# Altium schematic symbol library jlcpcb_2025_04_capacitors_extended_0201.schlib: 1175 symbols (part 6 of 7) (continued)
## LDK063ABJ105MP-F
designator C?  Capacitance: 1uF  (hidden comment: *)
Capacitor, Ceramic (MLCC), 1uF, ±20%, 10V, X5R, ±20%, SMD 0201; Manufacturer: Taiyo Yuden; Manufacturer Part Number: LDK063ABJ105MP-F; Package Size: 0201; JLCPCB Basic Part: No; JLCPCB Part Number: C319198; Supplier 1: LCSC; Category: Capacitors - MLCC; Supplier Part Number 1: C319198; Tolerance: ±20%; Voltage Rating: 10V; Temperature Coefficient: X5R; RoHS: Yes; ComponentLink1Description: Datasheet; ComponentLink1URL: https://wmsc.lcsc.com/wmsc/upload/file/pdf/v2/lcsc/1912111437_Taiyo-Yuden-LDK063ABJ105MP-F_C319198.pdf; ComponentLink2Description: JLCPCB Part URL; ComponentLink2URL: https://jlcpcb.com/partdetail/C319198; ComponentLink3Description: LCSC Part URL; ComponentLink3URL: https://lcsc.com/product-detail/Multilayer-Ceramic-Capacitors-MLCC---SMD-SMT_Taiyo-Yuden-Taiyo-Yuden-LDK063ABJ105MP-F_C319198.html
footprint CAP-0201 (0201 (0603M) Capacitor)
pins: 1, 2

## LDK063BBJ225MPLF
designator C?  Capacitance: 2.2uF  (hidden comment: *)
Capacitor, Ceramic (MLCC), 2.2uF, ±20%, 10V, X5R, ±20%, SMD 0201; Manufacturer: Taiyo Yuden; Manufacturer Part Number: LDK063BBJ225MPLF; Package Size: 0201; JLCPCB Basic Part: No; JLCPCB Part Number: C386031; Supplier 1: LCSC; Category: Capacitors - MLCC; Supplier Part Number 1: C386031; Tolerance: ±20%; Voltage Rating: 10V; Temperature Coefficient: X5R; RoHS: Yes; ComponentLink1Description: Datasheet; ComponentLink2Description: JLCPCB Part URL; ComponentLink2URL: https://jlcpcb.com/partdetail/C386031; ComponentLink3Description: LCSC Part URL; ComponentLink3URL: https://lcsc.com/product-detail/Multilayer-Ceramic-Capacitors-MLCC---SMD-SMT_Taiyo-Yuden-Taiyo-Yuden-LDK063BBJ225MPLF_C386031.html
footprint CAP-0201 (0201 (0603M) Capacitor)
pins: 1, 2

## LMK063BBJ105MPLF
designator C?  Capacitance: 1uF  (hidden comment: *)
Capacitor, Ceramic (MLCC), 1uF, ±20%, 10V, X5R, ±20%, SMD 0201; Manufacturer: Taiyo Yuden; Manufacturer Part Number: LMK063BBJ105MPLF; Package Size: 0201; JLCPCB Basic Part: No; JLCPCB Part Number: C386037; Supplier 1: LCSC; Category: Capacitors - MLCC; Supplier Part Number 1: C386037; Tolerance: ±20%; Voltage Rating: 10V; Temperature Coefficient: X5R; RoHS: Yes; ComponentLink1Description: Datasheet; ComponentLink1URL: https://wmsc.lcsc.com/wmsc/upload/file/pdf/v2/lcsc/1912111437_Taiyo-Yuden-LMK063BBJ105MPLF_C386037.pdf; ComponentLink2Description: JLCPCB Part URL; ComponentLink2URL: https://jlcpcb.com/partdetail/C386037; ComponentLink3Description: LCSC Part URL; ComponentLink3URL: https://lcsc.com/product-detail/Multilayer-Ceramic-Capacitors-MLCC---SMD-SMT_Taiyo-Yuden-Taiyo-Yuden-LMK063BBJ105MPLF_C386037.html
footprint CAP-0201 (0201 (0603M) Capacitor)
pins: 1, 2

## LMK063BJ224MP-F
designator C?  Capacitance: 220nF  (hidden comment: *)
Capacitor, Ceramic (MLCC), 220nF, ±20%, 10V, X5R, ±20%, SMD 0201; Manufacturer: Taiyo Yuden; Manufacturer Part Number: LMK063BJ224MP-F; Package Size: 0201; JLCPCB Basic Part: No; JLCPCB Part Number: C697608; Supplier 1: LCSC; Category: Capacitors - MLCC; Supplier Part Number 1: C697608; Tolerance: ±20%; Voltage Rating: 10V; Temperature Coefficient: X5R; RoHS: Yes; ComponentLink1Description: Datasheet; ComponentLink1URL: https://wmsc.lcsc.com/wmsc/upload/file/pdf/v2/lcsc/2007091536_Taiyo-Yuden-LMK063BJ224MP-F_C697608.pdf; ComponentLink2Description: JLCPCB Part URL; ComponentLink2URL: https://jlcpcb.com/partdetail/C697608; ComponentLink3Description: LCSC Part URL; ComponentLink3URL: https://lcsc.com/product-detail/Multilayer-Ceramic-Capacitors-MLCC---SMD-SMT_Taiyo-Yuden-Taiyo-Yuden-LMK063BJ224MP-F_C697608.html
footprint CAP-0201 (0201 (0603M) Capacitor)
pins: 1, 2

## LMK063C6224KP-F
designator C?  Capacitance: 220nF  (hidden comment: *)
Capacitor, Ceramic (MLCC), 220nF, ±10%, 10V, X6S, ±10%, SMD 0201; Manufacturer: Taiyo Yuden; Manufacturer Part Number: LMK063C6224KP-F; Package Size: 0201; JLCPCB Basic Part: No; JLCPCB Part Number: C386039; Supplier 1: LCSC; Category: Capacitors - MLCC; Supplier Part Number 1: C386039; Tolerance: ±10%; Voltage Rating: 10V; Temperature Coefficient: X6S; RoHS: Yes; ComponentLink1Description: Datasheet; ComponentLink1URL: https://wmsc.lcsc.com/wmsc/upload/file/pdf/v2/lcsc/2108160930_Taiyo-Yuden-LMK063C6224KP-F_C386039.pdf; ComponentLink2Description: JLCPCB Part URL; ComponentLink2URL: https://jlcpcb.com/partdetail/C386039; ComponentLink3Description: LCSC Part URL; ComponentLink3URL: https://lcsc.com/product-detail/Multilayer-Ceramic-Capacitors-MLCC---SMD-SMT_Taiyo-Yuden-Taiyo-Yuden-LMK063C6224KP-F_C386039.html
footprint CAP-0201 (0201 (0603M) Capacitor)
pins: 1, 2

## MSASL063BC6474KFNB33
designator C?  Capacitance: 0.47uF  (hidden comment: *)
Capacitor, Ceramic (MLCC), 0.47uF, ±10%, 10V, X6S, ±10%, SMD 0201; Manufacturer: Taiyo Yuden; Manufacturer Part Number: MSASL063BC6474KFNB33; Package Size: 0201; JLCPCB Basic Part: No; JLCPCB Part Number: C2169138; Supplier 1: LCSC; Category: Capacitors - MLCC; Supplier Part Number 1: C2169138; Tolerance: ±10%; Voltage Rating: 10V; Temperature Coefficient: X6S; RoHS: Yes; ComponentLink1Description: Datasheet; ComponentLink1URL: https://wmsc.lcsc.com/wmsc/upload/file/pdf/v2/lcsc/2307211405_Taiyo-Yuden-MSASL063BC6474KFNB33_C2169138.pdf; ComponentLink2Description: JLCPCB Part URL; ComponentLink2URL: https://jlcpcb.com/partdetail/C2169138; ComponentLink3Description: LCSC Part URL; ComponentLink3URL: https://lcsc.com/product-detail/Multilayer-Ceramic-Capacitors-MLCC---SMD-SMT_Taiyo-Yuden-Taiyo-Yuden-LMK063BC6474KPLF_C2169138.html
footprint CAP-0201 (0201 (0603M) Capacitor)
pins: 1, 2

## MSASU063SCG201JFNA01
designator C?  Capacitance: 200pF  (hidden comment: *)
Capacitor, Ceramic (MLCC), 200pF, ±5%, 50V, C0G, ±5%, SMD 0201; Manufacturer: Taiyo Yuden; Manufacturer Part Number: MSASU063SCG201JFNA01; Package Size: 0201; JLCPCB Basic Part: No; JLCPCB Part Number: C5383036; Supplier 1: LCSC; Category: Capacitors - MLCC; Supplier Part Number 1: C5383036; Tolerance: ±5%; Voltage Rating: 50V; Temperature Coefficient: C0G; RoHS: Yes; ComponentLink1Description: Datasheet; ComponentLink1URL: https://wmsc.lcsc.com/wmsc/upload/file/pdf/v2/lcsc/2303301000_Taiyo-Yuden-MSASU063SCG201JFNA01_C5383036.pdf; ComponentLink2Description: JLCPCB Part URL; ComponentLink2URL: https://jlcpcb.com/partdetail/C5383036; ComponentLink3Description: LCSC Part URL; ComponentLink3URL: https://lcsc.com/product-detail/Multilayer-Ceramic-Capacitors-MLCC---SMD-SMT_Taiyo-Yuden-Taiyo-Yuden-MSASU063SCG201JFNA01_C5383036.html
footprint CAP-0201 (0201 (0603M) Capacitor)
pins: 1, 2

## RF03N0R3B500CT
designator C?  Capacitance: 0.3pF  (hidden comment: *)
Capacitor, Ceramic (MLCC), 0.3pF, 50V, NP0, SMD 0201; Manufacturer: Walsin Tech Corp; Manufacturer Part Number: RF03N0R3B500CT; Package Size: 0201; JLCPCB Basic Part: No; JLCPCB Part Number: C172865; Supplier 1: LCSC; Category: Capacitors - MLCC; Supplier Part Number 1: C172865; Voltage Rating: 50V; Temperature Coefficient: NP0; RoHS: Yes; ComponentLink1Description: Datasheet; ComponentLink1URL: https://wmsc.lcsc.com/wmsc/upload/file/pdf/v2/lcsc/2110281730_Walsin-Tech-Corp-RF03N0R3B500CT_C172865.pdf; ComponentLink2Description: JLCPCB Part URL; ComponentLink2URL: https://jlcpcb.com/partdetail/C172865; ComponentLink3Description: LCSC Part URL; ComponentLink3URL: https://lcsc.com/product-detail/Multilayer-Ceramic-Capacitors-MLCC---SMD-SMT_Walsin-Tech-Corp-Walsin-Tech-Corp-RF03N0R3B500CT_C172865.html
footprint CAP-0201 (0201 (0603M) Capacitor)
pins: 1, 2

## RF03N0R4B500CT
designator C?  Capacitance: 0.4pF  (hidden comment: *)
Capacitor, Ceramic (MLCC), 0.4pF, 50V, NP0, SMD 0201; Manufacturer: Walsin Tech Corp; Manufacturer Part Number: RF03N0R4B500CT; Package Size: 0201; JLCPCB Basic Part: No; JLCPCB Part Number: C384705; Supplier 1: LCSC; Category: Capacitors - MLCC; Supplier Part Number 1: C384705; Voltage Rating: 50V; Temperature Coefficient: NP0; RoHS: Yes; ComponentLink1Description: Datasheet; ComponentLink1URL: https://wmsc.lcsc.com/wmsc/upload/file/pdf/v2/lcsc/1912111437_Walsin-Tech-Corp-RF03N0R4B500CT_C384705.pdf; ComponentLink2Description: JLCPCB Part URL; ComponentLink2URL: https://jlcpcb.com/partdetail/C384705; ComponentLink3Description: LCSC Part URL; ComponentLink3URL: https://lcsc.com/product-detail/Multilayer-Ceramic-Capacitors-MLCC---SMD-SMT_Walsin-Tech-Corp-Walsin-Tech-Corp-RF03N0R4B500CT_C384705.html
footprint CAP-0201 (0201 (0603M) Capacitor)
pins: 1, 2

## RF03N0R5A250CT
designator C?  Capacitance: 0.5pF  (hidden comment: *)
Capacitor, Ceramic (MLCC), 0.5pF, 25V, NP0, SMD 0201; Manufacturer: Walsin Tech Corp; Manufacturer Part Number: RF03N0R5A250CT; Package Size: 0201; JLCPCB Basic Part: No; JLCPCB Part Number: C384704; Supplier 1: LCSC; Category: Capacitors - MLCC; Supplier Part Number 1: C384704; Voltage Rating: 25V; Temperature Coefficient: NP0; RoHS: Yes; ComponentLink1Description: Datasheet; ComponentLink1URL: https://wmsc.lcsc.com/wmsc/upload/file/pdf/v2/lcsc/2401181555_Walsin-Tech-Corp-RF03N0R5A250CT_C384704.pdf; ComponentLink2Description: JLCPCB Part URL; ComponentLink2URL: https://jlcpcb.com/partdetail/C384704; ComponentLink3Description: LCSC Part URL; ComponentLink3URL: https://lcsc.com/product-detail/Multilayer-Ceramic-Capacitors-MLCC---SMD-SMT_Walsin-Tech-Corp-Walsin-Tech-Corp-RF03N0R5A250CT_C384704.html
footprint CAP-0201 (0201 (0603M) Capacitor)
pins: 1, 2

## RF03N0R5B250CT
designator C?  Capacitance: 0.5pF  (hidden comment: *)
Capacitor, Ceramic (MLCC), 0.5pF, 25V, NP0, SMD 0201; Manufacturer: Walsin Tech Corp; Manufacturer Part Number: RF03N0R5B250CT; Package Size: 0201; JLCPCB Basic Part: No; JLCPCB Part Number: C172836; Supplier 1: LCSC; Category: Capacitors - MLCC; Supplier Part Number 1: C172836; Voltage Rating: 25V; Temperature Coefficient: NP0; RoHS: Yes; ComponentLink1Description: Datasheet; ComponentLink1URL: https://wmsc.lcsc.com/wmsc/upload/file/pdf/v2/lcsc/2110281730_Walsin-Tech-Corp-RF03N0R5B250CT_C172836.pdf; ComponentLink2Description: JLCPCB Part URL; ComponentLink2URL: https://jlcpcb.com/partdetail/C172836; ComponentLink3Description: LCSC Part URL; ComponentLink3URL: https://lcsc.com/product-detail/Multilayer-Ceramic-Capacitors-MLCC---SMD-SMT_Walsin-Tech-Corp-Walsin-Tech-Corp-RF03N0R5B250CT_C172836.html
footprint CAP-0201 (0201 (0603M) Capacitor)
pins: 1, 2

## RF03N0R6B500CT
designator C?  Capacitance: 0.6pF  (hidden comment: *)
Capacitor, Ceramic (MLCC), 0.6pF, 50V, NP0, SMD 0201; Manufacturer: Walsin Tech Corp; Manufacturer Part Number: RF03N0R6B500CT; Package Size: 0201; JLCPCB Basic Part: No; JLCPCB Part Number: C384703; Supplier 1: LCSC; Category: Capacitors - MLCC; Supplier Part Number 1: C384703; Voltage Rating: 50V; Temperature Coefficient: NP0; RoHS: Yes; ComponentLink1Description: Datasheet; ComponentLink1URL: https://wmsc.lcsc.com/wmsc/upload/file/pdf/v2/lcsc/2401181555_Walsin-Tech-Corp-RF03N0R6B500CT_C384703.pdf; ComponentLink2Description: JLCPCB Part URL; ComponentLink2URL: https://jlcpcb.com/partdetail/C384703; ComponentLink3Description: LCSC Part URL; ComponentLink3URL: https://lcsc.com/product-detail/Multilayer-Ceramic-Capacitors-MLCC---SMD-SMT_Walsin-Tech-Corp-Walsin-Tech-Corp-RF03N0R6B500CT_C384703.html
footprint CAP-0201 (0201 (0603M) Capacitor)
pins: 1, 2

## RF03N0R7A500CT
designator C?  Capacitance: 0.7pF  (hidden comment: *)
Capacitor, Ceramic (MLCC), 0.7pF, 50V, NP0, SMD 0201; Manufacturer: Walsin Tech Corp; Manufacturer Part Number: RF03N0R7A500CT; Package Size: 0201; JLCPCB Basic Part: No; JLCPCB Part Number: C384702; Supplier 1: LCSC; Category: Capacitors - MLCC; Supplier Part Number 1: C384702; Voltage Rating: 50V; Temperature Coefficient: NP0; RoHS: Yes; ComponentLink1Description: Datasheet; ComponentLink2Description: JLCPCB Part URL; ComponentLink2URL: https://jlcpcb.com/partdetail/C384702; ComponentLink3Description: LCSC Part URL; ComponentLink3URL: https://lcsc.com/product-detail/Multilayer-Ceramic-Capacitors-MLCC---SMD-SMT_Walsin-Tech-Corp-Walsin-Tech-Corp-RF03N0R7A500CT_C384702.html
footprint CAP-0201 (0201 (0603M) Capacitor)
pins: 1, 2

## RF03N0R7B250CT
designator C?  Capacitance: 0.7pF  (hidden comment: *)
Capacitor, Ceramic (MLCC), 0.7pF, 25V, NP0, SMD 0201; Manufacturer: Walsin Tech Corp; Manufacturer Part Number: RF03N0R7B250CT; Package Size: 0201; JLCPCB Basic Part: No; JLCPCB Part Number: C384701; Supplier 1: LCSC; Category: Capacitors - MLCC; Supplier Part Number 1: C384701; Voltage Rating: 25V; Temperature Coefficient: NP0; RoHS: Yes; ComponentLink1Description: Datasheet; ComponentLink1URL: https://wmsc.lcsc.com/wmsc/upload/file/pdf/v2/lcsc/2401181554_Walsin-Tech-Corp-RF03N0R7B250CT_C384701.pdf; ComponentLink2Description: JLCPCB Part URL; ComponentLink2URL: https://jlcpcb.com/partdetail/C384701; ComponentLink3Description: LCSC Part URL; ComponentLink3URL: https://lcsc.com/product-detail/Multilayer-Ceramic-Capacitors-MLCC---SMD-SMT_Walsin-Tech-Corp-Walsin-Tech-Corp-RF03N0R7B250CT_C384701.html
footprint CAP-0201 (0201 (0603M) Capacitor)
pins: 1, 2

## RF03N0R7B500CT
designator C?  Capacitance: 0.7pF  (hidden comment: *)
Capacitor, Ceramic (MLCC), 0.7pF, 50V, NP0, SMD 0201; Manufacturer: Walsin Tech Corp; Manufacturer Part Number: RF03N0R7B500CT; Package Size: 0201; JLCPCB Basic Part: No; JLCPCB Part Number: C384700; Supplier 1: LCSC; Category: Capacitors - MLCC; Supplier Part Number 1: C384700; Voltage Rating: 50V; Temperature Coefficient: NP0; RoHS: Yes; ComponentLink1Description: Datasheet; ComponentLink1URL: https://wmsc.lcsc.com/wmsc/upload/file/pdf/v2/lcsc/2401181554_Walsin-Tech-Corp-RF03N0R7B500CT_C384700.pdf; ComponentLink2Description: JLCPCB Part URL; ComponentLink2URL: https://jlcpcb.com/partdetail/C384700; ComponentLink3Description: LCSC Part URL; ComponentLink3URL: https://lcsc.com/product-detail/Multilayer-Ceramic-Capacitors-MLCC---SMD-SMT_Walsin-Tech-Corp-Walsin-Tech-Corp-RF03N0R7B500CT_C384700.html
footprint CAP-0201 (0201 (0603M) Capacitor)
pins: 1, 2

## RF03N0R8B500CT
designator C?  Capacitance: 0.8pF  (hidden comment: *)
Capacitor, Ceramic (MLCC), 0.8pF, 50V, NP0, SMD 0201; Manufacturer: Walsin Tech Corp; Manufacturer Part Number: RF03N0R8B500CT; Package Size: 0201; JLCPCB Basic Part: No; JLCPCB Part Number: C384699; Supplier 1: LCSC; Category: Capacitors - MLCC; Supplier Part Number 1: C384699; Voltage Rating: 50V; Temperature Coefficient: NP0; RoHS: Yes; ComponentLink1Description: Datasheet; ComponentLink1URL: https://wmsc.lcsc.com/wmsc/upload/file/pdf/v2/lcsc/2401181554_Walsin-Tech-Corp-RF03N0R8B500CT_C384699.pdf; ComponentLink2Description: JLCPCB Part URL; ComponentLink2URL: https://jlcpcb.com/partdetail/C384699; ComponentLink3Description: LCSC Part URL; ComponentLink3URL: https://lcsc.com/product-detail/Multilayer-Ceramic-Capacitors-MLCC---SMD-SMT_Walsin-Tech-Corp-Walsin-Tech-Corp-RF03N0R8B500CT_C384699.html
footprint CAP-0201 (0201 (0603M) Capacitor)
pins: 1, 2

## RF03N0R9B500CT
designator C?  Capacitance: 0.9pF  (hidden comment: *)
Capacitor, Ceramic (MLCC), 0.9pF, 50V, NP0, SMD 0201; Manufacturer: Walsin Tech Corp; Manufacturer Part Number: RF03N0R9B500CT; Package Size: 0201; JLCPCB Basic Part: No; JLCPCB Part Number: C384698; Supplier 1: LCSC; Category: Capacitors - MLCC; Supplier Part Number 1: C384698; Voltage Rating: 50V; Temperature Coefficient: NP0; RoHS: Yes; ComponentLink1Description: Datasheet; ComponentLink2Description: JLCPCB Part URL; ComponentLink2URL: https://jlcpcb.com/partdetail/C384698; ComponentLink3Description: LCSC Part URL; ComponentLink3URL: https://lcsc.com/product-detail/Multilayer-Ceramic-Capacitors-MLCC---SMD-SMT_Walsin-Tech-Corp-Walsin-Tech-Corp-RF03N0R9B500CT_C384698.html
footprint CAP-0201 (0201 (0603M) Capacitor)
pins: 1, 2

## RF03N1R0A500CT
designator C?  Capacitance: 1pF  (hidden comment: *)
Capacitor, Ceramic (MLCC), 1pF, 50V, NP0, SMD 0201; Manufacturer: Walsin Tech Corp; Manufacturer Part Number: RF03N1R0A500CT; Package Size: 0201; JLCPCB Basic Part: No; JLCPCB Part Number: C384697; Supplier 1: LCSC; Category: Capacitors - MLCC; Supplier Part Number 1: C384697; Voltage Rating: 50V; Temperature Coefficient: NP0; RoHS: Yes; ComponentLink1Description: Datasheet; ComponentLink2Description: JLCPCB Part URL; ComponentLink2URL: https://jlcpcb.com/partdetail/C384697; ComponentLink3Description: LCSC Part URL; ComponentLink3URL: https://lcsc.com/product-detail/Multilayer-Ceramic-Capacitors-MLCC---SMD-SMT_Walsin-Tech-Corp-Walsin-Tech-Corp-RF03N1R0A500CT_C384697.html
footprint CAP-0201 (0201 (0603M) Capacitor)
pins: 1, 2

## RF03N1R0B250CT
designator C?  Capacitance: 1pF  (hidden comment: *)
Capacitor, Ceramic (MLCC), 1pF, 25V, NP0, SMD 0201; Manufacturer: Walsin Tech Corp; Manufacturer Part Number: RF03N1R0B250CT; Package Size: 0201; JLCPCB Basic Part: No; JLCPCB Part Number: C2894171; Supplier 1: LCSC; Category: Capacitors - MLCC; Supplier Part Number 1: C2894171; Voltage Rating: 25V; Temperature Coefficient: NP0; RoHS: Yes; ComponentLink1Description: Datasheet; ComponentLink1URL: https://wmsc.lcsc.com/wmsc/upload/file/pdf/v2/lcsc/2109081830_Walsin-Tech-Corp-RF03N1R0B250CT_C2894171.pdf; ComponentLink2Description: JLCPCB Part URL; ComponentLink2URL: https://jlcpcb.com/partdetail/C2894171; ComponentLink3Description: LCSC Part URL; ComponentLink3URL: https://lcsc.com/product-detail/Multilayer-Ceramic-Capacitors-MLCC---SMD-SMT_Walsin-Tech-Corp-Walsin-Tech-Corp-RF03N1R0B250CT_C2894171.html
footprint CAP-0201 (0201 (0603M) Capacitor)
pins: 1, 2

## RF03N1R3B250CT
designator C?  Capacitance: 1.3pF  (hidden comment: *)
Capacitor, Ceramic (MLCC), 1.3pF, 25V, NP0, SMD 0201; Manufacturer: Walsin Tech Corp; Manufacturer Part Number: RF03N1R3B250CT; Package Size: 0201; JLCPCB Basic Part: No; JLCPCB Part Number: C2894182; Supplier 1: LCSC; Category: Capacitors - MLCC; Supplier Part Number 1: C2894182; Voltage Rating: 25V; Temperature Coefficient: NP0; RoHS: Yes; ComponentLink1Description: Datasheet; ComponentLink1URL: https://wmsc.lcsc.com/wmsc/upload/file/pdf/v2/lcsc/2109081830_Walsin-Tech-Corp-RF03N1R3B250CT_C2894182.pdf; ComponentLink2Description: JLCPCB Part URL; ComponentLink2URL: https://jlcpcb.com/partdetail/C2894182; ComponentLink3Description: LCSC Part URL; ComponentLink3URL: https://lcsc.com/product-detail/Multilayer-Ceramic-Capacitors-MLCC---SMD-SMT_Walsin-Tech-Corp-Walsin-Tech-Corp-RF03N1R3B250CT_C2894182.html
footprint CAP-0201 (0201 (0603M) Capacitor)
pins: 1, 2

## RF03N1R3B500CT
designator C?  Capacitance: 1.3pF  (hidden comment: *)
Capacitor, Ceramic (MLCC), 1.3pF, 50V, NP0, SMD 0201; Manufacturer: Walsin Tech Corp; Manufacturer Part Number: RF03N1R3B500CT; Package Size: 0201; JLCPCB Basic Part: No; JLCPCB Part Number: C384696; Supplier 1: LCSC; Category: Capacitors - MLCC; Supplier Part Number 1: C384696; Voltage Rating: 50V; Temperature Coefficient: NP0; RoHS: Yes; ComponentLink1Description: Datasheet; ComponentLink2Description: JLCPCB Part URL; ComponentLink2URL: https://jlcpcb.com/partdetail/C384696; ComponentLink3Description: LCSC Part URL; ComponentLink3URL: https://lcsc.com/product-detail/Multilayer-Ceramic-Capacitors-MLCC---SMD-SMT_Walsin-Tech-Corp-Walsin-Tech-Corp-RF03N1R3B500CT_C384696.html
footprint CAP-0201 (0201 (0603M) Capacitor)
pins: 1, 2

## RF03N1R4B250CT
designator C?  Capacitance: 1.4pF  (hidden comment: *)
Capacitor, Ceramic (MLCC), 1.4pF, 25V, NP0, SMD 0201; Manufacturer: Walsin Tech Corp; Manufacturer Part Number: RF03N1R4B250CT; Package Size: 0201; JLCPCB Basic Part: No; JLCPCB Part Number: C396862; Supplier 1: LCSC; Category: Capacitors - MLCC; Supplier Part Number 1: C396862; Voltage Rating: 25V; Temperature Coefficient: NP0; RoHS: Yes; ComponentLink1Description: Datasheet; ComponentLink1URL: https://wmsc.lcsc.com/wmsc/upload/file/pdf/v2/lcsc/2304140030_Walsin-Tech-Corp-RF03N1R4B250CT_C396862.pdf; ComponentLink2Description: JLCPCB Part URL; ComponentLink2URL: https://jlcpcb.com/partdetail/C396862; ComponentLink3Description: LCSC Part URL; ComponentLink3URL: https://lcsc.com/product-detail/Multilayer-Ceramic-Capacitors-MLCC---SMD-SMT_Walsin-Tech-Corp-Walsin-Tech-Corp-RF03N1R4B250CT_C396862.html
footprint CAP-0201 (0201 (0603M) Capacitor)
pins: 1, 2

## RF03N1R6B250CT
designator C?  Capacitance: 1.6pF  (hidden comment: *)
Capacitor, Ceramic (MLCC), 1.6pF, 25V, NP0, SMD 0201; Manufacturer: Walsin Tech Corp; Manufacturer Part Number: RF03N1R6B250CT; Package Size: 0201; JLCPCB Basic Part: No; JLCPCB Part Number: C384695; Supplier 1: LCSC; Category: Capacitors - MLCC; Supplier Part Number 1: C384695; Voltage Rating: 25V; Temperature Coefficient: NP0; RoHS: Yes; ComponentLink1Description: Datasheet; ComponentLink1URL: https://wmsc.lcsc.com/wmsc/upload/file/pdf/v2/lcsc/2401181554_Walsin-Tech-Corp-RF03N1R6B250CT_C384695.pdf; ComponentLink2Description: JLCPCB Part URL; ComponentLink2URL: https://jlcpcb.com/partdetail/C384695; ComponentLink3Description: LCSC Part URL; ComponentLink3URL: https://lcsc.com/product-detail/Multilayer-Ceramic-Capacitors-MLCC---SMD-SMT_Walsin-Tech-Corp-Walsin-Tech-Corp-RF03N1R6B250CT_C384695.html
footprint CAP-0201 (0201 (0603M) Capacitor)
pins: 1, 2

## RF03N1R8A500CT
designator C?  Capacitance: 1.8pF  (hidden comment: *)
Capacitor, Ceramic (MLCC), 1.8pF, 50V, NP0, SMD 0201; Manufacturer: Walsin Tech Corp; Manufacturer Part Number: RF03N1R8A500CT; Package Size: 0201; JLCPCB Basic Part: No; JLCPCB Part Number: C384694; Supplier 1: LCSC; Category: Capacitors - MLCC; Supplier Part Number 1: C384694; Voltage Rating: 50V; Temperature Coefficient: NP0; RoHS: Yes; ComponentLink1Description: Datasheet; ComponentLink2Description: JLCPCB Part URL; ComponentLink2URL: https://jlcpcb.com/partdetail/C384694; ComponentLink3Description: LCSC Part URL; ComponentLink3URL: https://lcsc.com/product-detail/Multilayer-Ceramic-Capacitors-MLCC---SMD-SMT_Walsin-Tech-Corp-Walsin-Tech-Corp-RF03N1R8A500CT_C384694.html
footprint CAP-0201 (0201 (0603M) Capacitor)
pins: 1, 2

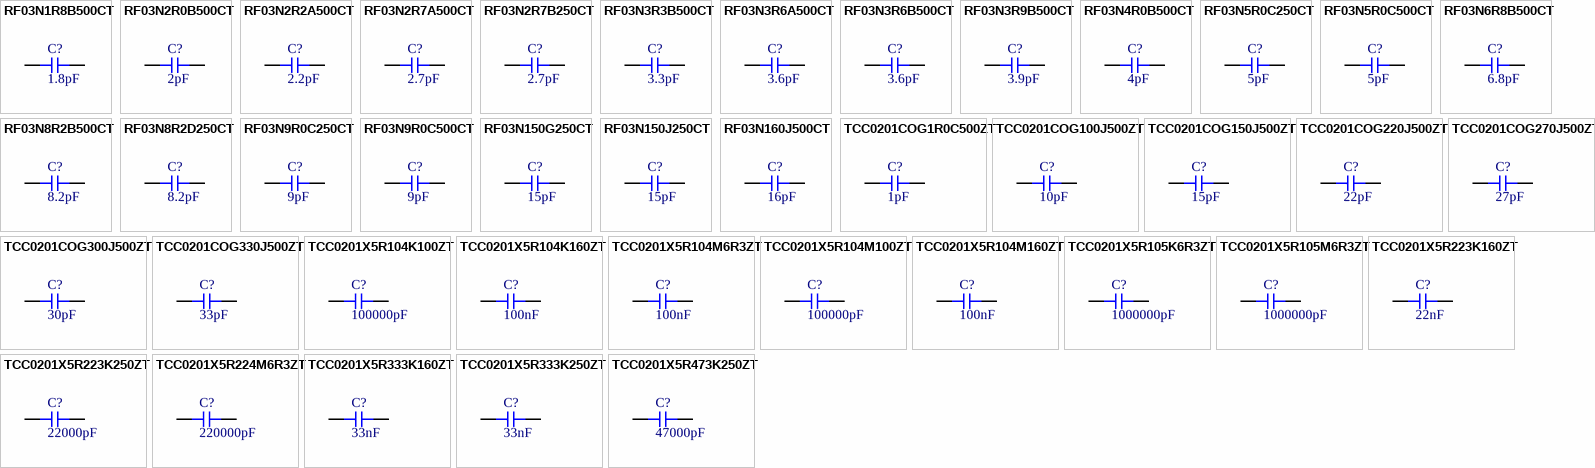
[diagram p27: symbols RF03N1R8B500CT to TCC0201X5R473K250ZT]

## RF03N1R8B500CT
designator C?  Capacitance: 1.8pF  (hidden comment: *)
Capacitor, Ceramic (MLCC), 1.8pF, 50V, NP0, SMD 0201; Manufacturer: Walsin Tech Corp; Manufacturer Part Number: RF03N1R8B500CT; Package Size: 0201; JLCPCB Basic Part: No; JLCPCB Part Number: C2875466; Supplier 1: LCSC; Category: Capacitors - MLCC; Supplier Part Number 1: C2875466; Voltage Rating: 50V; Temperature Coefficient: NP0; RoHS: Yes; ComponentLink1Description: Datasheet; ComponentLink1URL: https://wmsc.lcsc.com/wmsc/upload/file/pdf/v2/lcsc/2108241230_Walsin-Tech-Corp-RF03N1R8B500CT_C2875466.pdf; ComponentLink2Description: JLCPCB Part URL; ComponentLink2URL: https://jlcpcb.com/partdetail/C2875466; ComponentLink3Description: LCSC Part URL; ComponentLink3URL: https://lcsc.com/product-detail/Multilayer-Ceramic-Capacitors-MLCC---SMD-SMT_Walsin-Tech-Corp-Walsin-Tech-Corp-RF03N1R8B500CT_C2875466.html
footprint CAP-0201 (0201 (0603M) Capacitor)
pins: 1, 2

## RF03N2R0B500CT
designator C?  Capacitance: 2pF  (hidden comment: *)
Capacitor, Ceramic (MLCC), 2pF, 50V, NP0, SMD 0201; Manufacturer: Walsin Tech Corp; Manufacturer Part Number: RF03N2R0B500CT; Package Size: 0201; JLCPCB Basic Part: No; JLCPCB Part Number: C880868; Supplier 1: LCSC; Category: Capacitors - MLCC; Supplier Part Number 1: C880868; Voltage Rating: 50V; Temperature Coefficient: NP0; RoHS: Yes; ComponentLink1Description: Datasheet; ComponentLink1URL: https://wmsc.lcsc.com/wmsc/upload/file/pdf/v2/lcsc/2010162041_Walsin-Tech-Corp-RF03N2R0B500CT_C880868.pdf; ComponentLink2Description: JLCPCB Part URL; ComponentLink2URL: https://jlcpcb.com/partdetail/C880868; ComponentLink3Description: LCSC Part URL; ComponentLink3URL: https://lcsc.com/product-detail/Multilayer-Ceramic-Capacitors-MLCC---SMD-SMT_Walsin-Tech-Corp-Walsin-Tech-Corp-RF03N2R0B500CT_C880868.html
footprint CAP-0201 (0201 (0603M) Capacitor)
pins: 1, 2

## RF03N2R2A500CT
designator C?  Capacitance: 2.2pF  (hidden comment: *)
Capacitor, Ceramic (MLCC), 2.2pF, 50V, NP0, SMD 0201; Manufacturer: Walsin Tech Corp; Manufacturer Part Number: RF03N2R2A500CT; Package Size: 0201; JLCPCB Basic Part: No; JLCPCB Part Number: C384693; Supplier 1: LCSC; Category: Capacitors - MLCC; Supplier Part Number 1: C384693; Voltage Rating: 50V; Temperature Coefficient: NP0; RoHS: Yes; ComponentLink1Description: Datasheet; ComponentLink2Description: JLCPCB Part URL; ComponentLink2URL: https://jlcpcb.com/partdetail/C384693; ComponentLink3Description: LCSC Part URL; ComponentLink3URL: https://lcsc.com/product-detail/Multilayer-Ceramic-Capacitors-MLCC---SMD-SMT_Walsin-Tech-Corp-Walsin-Tech-Corp-RF03N2R2A500CT_C384693.html
footprint CAP-0201 (0201 (0603M) Capacitor)
pins: 1, 2

## RF03N2R7A500CT
designator C?  Capacitance: 2.7pF  (hidden comment: *)
Capacitor, Ceramic (MLCC), 2.7pF, 50V, NP0, SMD 0201; Manufacturer: Walsin Tech Corp; Manufacturer Part Number: RF03N2R7A500CT; Package Size: 0201; JLCPCB Basic Part: No; JLCPCB Part Number: C384692; Supplier 1: LCSC; Category: Capacitors - MLCC; Supplier Part Number 1: C384692; Voltage Rating: 50V; Temperature Coefficient: NP0; RoHS: Yes; ComponentLink1Description: Datasheet; ComponentLink2Description: JLCPCB Part URL; ComponentLink2URL: https://jlcpcb.com/partdetail/C384692; ComponentLink3Description: LCSC Part URL; ComponentLink3URL: https://lcsc.com/product-detail/Multilayer-Ceramic-Capacitors-MLCC---SMD-SMT_Walsin-Tech-Corp-Walsin-Tech-Corp-RF03N2R7A500CT_C384692.html
footprint CAP-0201 (0201 (0603M) Capacitor)
pins: 1, 2

## RF03N2R7B250CT
designator C?  Capacitance: 2.7pF  (hidden comment: *)
Capacitor, Ceramic (MLCC), 2.7pF, 25V, NP0, SMD 0201; Manufacturer: Walsin Tech Corp; Manufacturer Part Number: RF03N2R7B250CT; Package Size: 0201; JLCPCB Basic Part: No; JLCPCB Part Number: C396863; Supplier 1: LCSC; Category: Capacitors - MLCC; Supplier Part Number 1: C396863; Voltage Rating: 25V; Temperature Coefficient: NP0; RoHS: Yes; ComponentLink1Description: Datasheet; ComponentLink1URL: https://wmsc.lcsc.com/wmsc/upload/file/pdf/v2/lcsc/2304140030_Walsin-Tech-Corp-RF03N2R7B250CT_C396863.pdf; ComponentLink2Description: JLCPCB Part URL; ComponentLink2URL: https://jlcpcb.com/partdetail/C396863; ComponentLink3Description: LCSC Part URL; ComponentLink3URL: https://lcsc.com/product-detail/Multilayer-Ceramic-Capacitors-MLCC---SMD-SMT_Walsin-Tech-Corp-Walsin-Tech-Corp-RF03N2R7B250CT_C396863.html
footprint CAP-0201 (0201 (0603M) Capacitor)
pins: 1, 2

## RF03N3R3B500CT
designator C?  Capacitance: 3.3pF  (hidden comment: *)
Capacitor, Ceramic (MLCC), 3.3pF, 50V, NP0, SMD 0201; Manufacturer: Walsin Tech Corp; Manufacturer Part Number: RF03N3R3B500CT; Package Size: 0201; JLCPCB Basic Part: No; JLCPCB Part Number: C2894174; Supplier 1: LCSC; Category: Capacitors - MLCC; Supplier Part Number 1: C2894174; Voltage Rating: 50V; Temperature Coefficient: NP0; RoHS: Yes; ComponentLink1Description: Datasheet; ComponentLink1URL: https://wmsc.lcsc.com/wmsc/upload/file/pdf/v2/lcsc/2109081830_Walsin-Tech-Corp-RF03N3R3B500CT_C2894174.pdf; ComponentLink2Description: JLCPCB Part URL; ComponentLink2URL: https://jlcpcb.com/partdetail/C2894174; ComponentLink3Description: LCSC Part URL; ComponentLink3URL: https://lcsc.com/product-detail/Multilayer-Ceramic-Capacitors-MLCC---SMD-SMT_Walsin-Tech-Corp-Walsin-Tech-Corp-RF03N3R3B500CT_C2894174.html
footprint CAP-0201 (0201 (0603M) Capacitor)
pins: 1, 2

## RF03N3R6A500CT
designator C?  Capacitance: 3.6pF  (hidden comment: *)
Capacitor, Ceramic (MLCC), 3.6pF, 50V, NP0, SMD 0201; Manufacturer: Walsin Tech Corp; Manufacturer Part Number: RF03N3R6A500CT; Package Size: 0201; JLCPCB Basic Part: No; JLCPCB Part Number: C2909456; Supplier 1: LCSC; Category: Capacitors - MLCC; Supplier Part Number 1: C2909456; Voltage Rating: 50V; Temperature Coefficient: NP0; RoHS: Yes; ComponentLink1Description: Datasheet; ComponentLink1URL: https://wmsc.lcsc.com/wmsc/upload/file/pdf/v2/lcsc/2110281730_Walsin-Tech-Corp-RF03N3R6A500CT_C2909456.pdf; ComponentLink2Description: JLCPCB Part URL; ComponentLink2URL: https://jlcpcb.com/partdetail/C2909456; ComponentLink3Description: LCSC Part URL; ComponentLink3URL: https://lcsc.com/product-detail/Multilayer-Ceramic-Capacitors-MLCC---SMD-SMT_Walsin-Tech-Corp-Walsin-Tech-Corp-RF03N3R6A500CT_C2909456.html
footprint CAP-0201 (0201 (0603M) Capacitor)
pins: 1, 2

## RF03N3R6B500CT
designator C?  Capacitance: 3.6pF  (hidden comment: *)
Capacitor, Ceramic (MLCC), 3.6pF, 50V, NP0, SMD 0201; Manufacturer: Walsin Tech Corp; Manufacturer Part Number: RF03N3R6B500CT; Package Size: 0201; JLCPCB Basic Part: No; JLCPCB Part Number: C384691; Supplier 1: LCSC; Category: Capacitors - MLCC; Supplier Part Number 1: C384691; Voltage Rating: 50V; Temperature Coefficient: NP0; RoHS: Yes; ComponentLink1Description: Datasheet; ComponentLink2Description: JLCPCB Part URL; ComponentLink2URL: https://jlcpcb.com/partdetail/C384691; ComponentLink3Description: LCSC Part URL; ComponentLink3URL: https://lcsc.com/product-detail/Multilayer-Ceramic-Capacitors-MLCC---SMD-SMT_Walsin-Tech-Corp-Walsin-Tech-Corp-RF03N3R6B500CT_C384691.html
footprint CAP-0201 (0201 (0603M) Capacitor)
pins: 1, 2

## RF03N3R9B500CT
designator C?  Capacitance: 3.9pF  (hidden comment: *)
Capacitor, Ceramic (MLCC), 3.9pF, 50V, NP0, SMD 0201; Manufacturer: Walsin Tech Corp; Manufacturer Part Number: RF03N3R9B500CT; Package Size: 0201; JLCPCB Basic Part: No; JLCPCB Part Number: C2918155; Supplier 1: LCSC; Category: Capacitors - MLCC; Supplier Part Number 1: C2918155; Voltage Rating: 50V; Temperature Coefficient: NP0; RoHS: Yes; ComponentLink1Description: Datasheet; ComponentLink1URL: https://wmsc.lcsc.com/wmsc/upload/file/pdf/v2/lcsc/2207111830_Walsin-Tech-Corp-RF03N3R9B500CT_C2918155.pdf; ComponentLink2Description: JLCPCB Part URL; ComponentLink2URL: https://jlcpcb.com/partdetail/C2918155; ComponentLink3Description: LCSC Part URL; ComponentLink3URL: https://lcsc.com/product-detail/Multilayer-Ceramic-Capacitors-MLCC---SMD-SMT_Walsin-Tech-Corp-Walsin-Tech-Corp-RF03N3R9B500CT_C2918155.html
footprint CAP-0201 (0201 (0603M) Capacitor)
pins: 1, 2

## RF03N4R0B500CT
designator C?  Capacitance: 4pF  (hidden comment: *)
Capacitor, Ceramic (MLCC), 4pF, 50V, NP0, SMD 0201; Manufacturer: Walsin Tech Corp; Manufacturer Part Number: RF03N4R0B500CT; Package Size: 0201; JLCPCB Basic Part: No; JLCPCB Part Number: C384690; Supplier 1: LCSC; Category: Capacitors - MLCC; Supplier Part Number 1: C384690; Voltage Rating: 50V; Temperature Coefficient: NP0; RoHS: Yes; ComponentLink1Description: Datasheet; ComponentLink1URL: https://wmsc.lcsc.com/wmsc/upload/file/pdf/v2/lcsc/2401181554_Walsin-Tech-Corp-RF03N4R0B500CT_C384690.pdf; ComponentLink2Description: JLCPCB Part URL; ComponentLink2URL: https://jlcpcb.com/partdetail/C384690; ComponentLink3Description: LCSC Part URL; ComponentLink3URL: https://lcsc.com/product-detail/Multilayer-Ceramic-Capacitors-MLCC---SMD-SMT_Walsin-Tech-Corp-Walsin-Tech-Corp-RF03N4R0B500CT_C384690.html
footprint CAP-0201 (0201 (0603M) Capacitor)
pins: 1, 2

## RF03N5R0C250CT
designator C?  Capacitance: 5pF  (hidden comment: *)
Capacitor, Ceramic (MLCC), 5pF, 25V, C0G, SMD 0201; Manufacturer: Walsin Tech Corp; Manufacturer Part Number: RF03N5R0C250CT; Package Size: 0201; JLCPCB Basic Part: No; JLCPCB Part Number: C3851003; Supplier 1: LCSC; Category: Capacitors - MLCC; Supplier Part Number 1: C3851003; Voltage Rating: 25V; Temperature Coefficient: C0G; RoHS: Yes; ComponentLink1Description: Datasheet; ComponentLink1URL: https://wmsc.lcsc.com/wmsc/upload/file/pdf/v2/lcsc/2401181607_Walsin-Tech-Corp-RF03N5R0C250CT_C3851003.pdf; ComponentLink2Description: JLCPCB Part URL; ComponentLink2URL: https://jlcpcb.com/partdetail/C3851003; ComponentLink3Description: LCSC Part URL; ComponentLink3URL: https://lcsc.com/product-detail/Multilayer-Ceramic-Capacitors-MLCC---SMD-SMT_Walsin-Tech-Corp-Walsin-Tech-Corp-RF03N5R0C250CT_C3851003.html
footprint CAP-0201 (0201 (0603M) Capacitor)
pins: 1, 2

## RF03N5R0C500CT
designator C?  Capacitance: 5pF  (hidden comment: *)
Capacitor, Ceramic (MLCC), 5pF, 50V, NP0, SMD 0201; Manufacturer: Walsin Tech Corp; Manufacturer Part Number: RF03N5R0C500CT; Package Size: 0201; JLCPCB Basic Part: No; JLCPCB Part Number: C2991497; Supplier 1: LCSC; Category: Capacitors - MLCC; Supplier Part Number 1: C2991497; Voltage Rating: 50V; Temperature Coefficient: NP0; RoHS: Yes; ComponentLink1Description: Datasheet; ComponentLink1URL: https://wmsc.lcsc.com/wmsc/upload/file/pdf/v2/lcsc/2204081930_Walsin-Tech-Corp-RF03N5R0C500CT_C2991497.pdf; ComponentLink2Description: JLCPCB Part URL; ComponentLink2URL: https://jlcpcb.com/partdetail/C2991497; ComponentLink3Description: LCSC Part URL; ComponentLink3URL: https://lcsc.com/product-detail/Multilayer-Ceramic-Capacitors-MLCC---SMD-SMT_Walsin-Tech-Corp-Walsin-Tech-Corp-RF03N5R0C500CT_C2991497.html
footprint CAP-0201 (0201 (0603M) Capacitor)
pins: 1, 2

## RF03N6R8B500CT
designator C?  Capacitance: 6.8pF  (hidden comment: *)
Capacitor, Ceramic (MLCC), 6.8pF, 50V, NP0, SMD 0201; Manufacturer: Walsin Tech Corp; Manufacturer Part Number: RF03N6R8B500CT; Package Size: 0201; JLCPCB Basic Part: No; JLCPCB Part Number: C2859300; Supplier 1: LCSC; Category: Capacitors - MLCC; Supplier Part Number 1: C2859300; Voltage Rating: 50V; Temperature Coefficient: NP0; RoHS: Yes; ComponentLink1Description: Datasheet; ComponentLink1URL: https://wmsc.lcsc.com/wmsc/upload/file/pdf/v2/lcsc/2108150330_Walsin-Tech-Corp-RF03N6R8B500CT_C2859300.pdf; ComponentLink2Description: JLCPCB Part URL; ComponentLink2URL: https://jlcpcb.com/partdetail/C2859300; ComponentLink3Description: LCSC Part URL; ComponentLink3URL: https://lcsc.com/product-detail/Multilayer-Ceramic-Capacitors-MLCC---SMD-SMT_Walsin-Tech-Corp-Walsin-Tech-Corp-RF03N6R8B500CT_C2859300.html
footprint CAP-0201 (0201 (0603M) Capacitor)
pins: 1, 2

## RF03N8R2B500CT
designator C?  Capacitance: 8.2pF  (hidden comment: *)
Capacitor, Ceramic (MLCC), 8.2pF, 50V, NP0, SMD 0201; Manufacturer: Walsin Tech Corp; Manufacturer Part Number: RF03N8R2B500CT; Package Size: 0201; JLCPCB Basic Part: No; JLCPCB Part Number: C384686; Supplier 1: LCSC; Category: Capacitors - MLCC; Supplier Part Number 1: C384686; Voltage Rating: 50V; Temperature Coefficient: NP0; RoHS: Yes; ComponentLink1Description: Datasheet; ComponentLink1URL: https://wmsc.lcsc.com/wmsc/upload/file/pdf/v2/lcsc/2401181554_Walsin-Tech-Corp-RF03N8R2B500CT_C384686.pdf; ComponentLink2Description: JLCPCB Part URL; ComponentLink2URL: https://jlcpcb.com/partdetail/C384686; ComponentLink3Description: LCSC Part URL; ComponentLink3URL: https://lcsc.com/product-detail/Multilayer-Ceramic-Capacitors-MLCC---SMD-SMT_Walsin-Tech-Corp-Walsin-Tech-Corp-RF03N8R2B500CT_C384686.html
footprint CAP-0201 (0201 (0603M) Capacitor)
pins: 1, 2

## RF03N8R2D250CT
designator C?  Capacitance: 8.2pF  (hidden comment: *)
Capacitor, Ceramic (MLCC), 8.2pF, 25V, NP0, SMD 0201; Manufacturer: Walsin Tech Corp; Manufacturer Part Number: RF03N8R2D250CT; Package Size: 0201; JLCPCB Basic Part: No; JLCPCB Part Number: C304674; Supplier 1: LCSC; Category: Capacitors - MLCC; Supplier Part Number 1: C304674; Voltage Rating: 25V; Temperature Coefficient: NP0; RoHS: Yes; ComponentLink1Description: Datasheet; ComponentLink1URL: https://wmsc.lcsc.com/wmsc/upload/file/pdf/v2/lcsc/2304140030_Walsin-Tech-Corp-RF03N8R2D250CT_C304674.pdf; ComponentLink2Description: JLCPCB Part URL; ComponentLink2URL: https://jlcpcb.com/partdetail/C304674; ComponentLink3Description: LCSC Part URL; ComponentLink3URL: https://lcsc.com/product-detail/Multilayer-Ceramic-Capacitors-MLCC---SMD-SMT_Walsin-Tech-Corp-Walsin-Tech-Corp-RF03N8R2D250CT_C304674.html
footprint CAP-0201 (0201 (0603M) Capacitor)
pins: 1, 2

## RF03N9R0C250CT
designator C?  Capacitance: 9pF  (hidden comment: *)
Capacitor, Ceramic (MLCC), 9pF, 25V, NP0, SMD 0201; Manufacturer: Walsin Tech Corp; Manufacturer Part Number: RF03N9R0C250CT; Package Size: 0201; JLCPCB Basic Part: No; JLCPCB Part Number: C180263; Supplier 1: LCSC; Category: Capacitors - MLCC; Supplier Part Number 1: C180263; Voltage Rating: 25V; Temperature Coefficient: NP0; RoHS: Yes; ComponentLink1Description: Datasheet; ComponentLink1URL: https://wmsc.lcsc.com/wmsc/upload/file/pdf/v2/lcsc/2304140030_Walsin-Tech-Corp-RF03N9R0C250CT_C180263.pdf; ComponentLink2Description: JLCPCB Part URL; ComponentLink2URL: https://jlcpcb.com/partdetail/C180263; ComponentLink3Description: LCSC Part URL; ComponentLink3URL: https://lcsc.com/product-detail/Multilayer-Ceramic-Capacitors-MLCC---SMD-SMT_Walsin-Tech-Corp-Walsin-Tech-Corp-RF03N9R0C250CT_C180263.html
footprint CAP-0201 (0201 (0603M) Capacitor)
pins: 1, 2

## RF03N9R0C500CT
designator C?  Capacitance: 9pF  (hidden comment: *)
Capacitor, Ceramic (MLCC), 9pF, 50V, NP0, SMD 0201; Manufacturer: Walsin Tech Corp; Manufacturer Part Number: RF03N9R0C500CT; Package Size: 0201; JLCPCB Basic Part: No; JLCPCB Part Number: C180262; Supplier 1: LCSC; Category: Capacitors - MLCC; Supplier Part Number 1: C180262; Voltage Rating: 50V; Temperature Coefficient: NP0; RoHS: Yes; ComponentLink1Description: Datasheet; ComponentLink1URL: https://wmsc.lcsc.com/wmsc/upload/file/pdf/v2/lcsc/2304140030_Walsin-Tech-Corp-RF03N9R0C500CT_C180262.pdf; ComponentLink2Description: JLCPCB Part URL; ComponentLink2URL: https://jlcpcb.com/partdetail/C180262; ComponentLink3Description: LCSC Part URL; ComponentLink3URL: https://lcsc.com/product-detail/Multilayer-Ceramic-Capacitors-MLCC---SMD-SMT_Walsin-Tech-Corp-Walsin-Tech-Corp-RF03N9R0C500CT_C180262.html
footprint CAP-0201 (0201 (0603M) Capacitor)
pins: 1, 2

## RF03N150G250CT
designator C?  Capacitance: 15pF  (hidden comment: *)
Capacitor, Ceramic (MLCC), 15pF, ±2%, 25V, NP0, ±2%, SMD 0201; Manufacturer: Walsin Tech Corp; Manufacturer Part Number: RF03N150G250CT; Package Size: 0201; JLCPCB Basic Part: No; JLCPCB Part Number: C396861; Supplier 1: LCSC; Category: Capacitors - MLCC; Supplier Part Number 1: C396861; Tolerance: ±2%; Voltage Rating: 25V; Temperature Coefficient: NP0; RoHS: Yes; ComponentLink1Description: Datasheet; ComponentLink1URL: https://wmsc.lcsc.com/wmsc/upload/file/pdf/v2/lcsc/2304140030_Walsin-Tech-Corp-RF03N150G250CT_C396861.pdf; ComponentLink2Description: JLCPCB Part URL; ComponentLink2URL: https://jlcpcb.com/partdetail/C396861; ComponentLink3Description: LCSC Part URL; ComponentLink3URL: https://lcsc.com/product-detail/Multilayer-Ceramic-Capacitors-MLCC---SMD-SMT_Walsin-Tech-Corp-Walsin-Tech-Corp-RF03N150G250CT_C396861.html
footprint CAP-0201 (0201 (0603M) Capacitor)
pins: 1, 2

## RF03N150J250CT
designator C?  Capacitance: 15pF  (hidden comment: *)
Capacitor, Ceramic (MLCC), 15pF, ±5%, 25V, NP0, ±5%, SMD 0201; Manufacturer: Walsin Tech Corp; Manufacturer Part Number: RF03N150J250CT; Package Size: 0201; JLCPCB Basic Part: No; JLCPCB Part Number: C304668; Supplier 1: LCSC; Category: Capacitors - MLCC; Supplier Part Number 1: C304668; Tolerance: ±5%; Voltage Rating: 25V; Temperature Coefficient: NP0; RoHS: Yes; ComponentLink1Description: Datasheet; ComponentLink1URL: https://wmsc.lcsc.com/wmsc/upload/file/pdf/v2/lcsc/2304140030_Walsin-Tech-Corp-RF03N150J250CT_C304668.pdf; ComponentLink2Description: JLCPCB Part URL; ComponentLink2URL: https://jlcpcb.com/partdetail/C304668; ComponentLink3Description: LCSC Part URL; ComponentLink3URL: https://lcsc.com/product-detail/Multilayer-Ceramic-Capacitors-MLCC---SMD-SMT_Walsin-Tech-Corp-Walsin-Tech-Corp-RF03N150J250CT_C304668.html
footprint CAP-0201 (0201 (0603M) Capacitor)
pins: 1, 2

## RF03N160J500CT
designator C?  Capacitance: 16pF  (hidden comment: *)
Capacitor, Ceramic (MLCC), 16pF, ±5%, 50V, NP0, ±5%, SMD 0201; Manufacturer: Walsin Tech Corp; Manufacturer Part Number: RF03N160J500CT; Package Size: 0201; JLCPCB Basic Part: No; JLCPCB Part Number: C304669; Supplier 1: LCSC; Category: Capacitors - MLCC; Supplier Part Number 1: C304669; Tolerance: ±5%; Voltage Rating: 50V; Temperature Coefficient: NP0; RoHS: Yes; ComponentLink1Description: Datasheet; ComponentLink1URL: https://wmsc.lcsc.com/wmsc/upload/file/pdf/v2/lcsc/2304140030_Walsin-Tech-Corp-RF03N160J500CT_C304669.pdf; ComponentLink2Description: JLCPCB Part URL; ComponentLink2URL: https://jlcpcb.com/partdetail/C304669; ComponentLink3Description: LCSC Part URL; ComponentLink3URL: https://lcsc.com/product-detail/Multilayer-Ceramic-Capacitors-MLCC---SMD-SMT_Walsin-Tech-Corp-Walsin-Tech-Corp-RF03N160J500CT_C304669.html
footprint CAP-0201 (0201 (0603M) Capacitor)
pins: 1, 2

## TCC0201COG1R0C500ZT
designator C?  Capacitance: 1pF  (hidden comment: *)
Capacitor, Ceramic (MLCC), 1pF, 50V, C0G, SMD 0201; Manufacturer: CCTC; Manufacturer Part Number: TCC0201COG1R0C500ZT; Package Size: 0201; JLCPCB Basic Part: No; JLCPCB Part Number: C18164552; Supplier 1: LCSC; Category: Capacitors - MLCC; Supplier Part Number 1: C18164552; Voltage Rating: 50V; Temperature Coefficient: C0G; RoHS: Yes; ComponentLink1Description: Datasheet; ComponentLink1URL: https://wmsc.lcsc.com/wmsc/upload/file/pdf/v2/lcsc/2309141701_CCTC-TCC0201COG1R0C500ZT_C18164552.pdf; ComponentLink2Description: JLCPCB Part URL; ComponentLink2URL: https://jlcpcb.com/partdetail/C18164552; ComponentLink3Description: LCSC Part URL; ComponentLink3URL: https://lcsc.com/product-detail/Multilayer-Ceramic-Capacitors-MLCC---SMD-SMT_CCTC-CCTC-TCC0201COG1R0C500ZT_C18164552.html
footprint CAP-0201 (0201 (0603M) Capacitor)
pins: 1, 2

## TCC0201COG100J500ZT
designator C?  Capacitance: 10pF  (hidden comment: *)
Capacitor, Ceramic (MLCC), 10pF, ±5%, 50V, C0G, ±5%, SMD 0201; Manufacturer: CCTC; Manufacturer Part Number: TCC0201COG100J500ZT; Package Size: 0201; JLCPCB Basic Part: No; JLCPCB Part Number: C5142552; Supplier 1: LCSC; Category: Capacitors - MLCC; Supplier Part Number 1: C5142552; Tolerance: ±5%; Voltage Rating: 50V; Temperature Coefficient: C0G; RoHS: Yes; ComponentLink1Description: Datasheet; ComponentLink1URL: https://wmsc.lcsc.com/wmsc/upload/file/pdf/v2/lcsc/2209011730_CCTC-TCC0201COG100J500ZT_C5142552.pdf; ComponentLink2Description: JLCPCB Part URL; ComponentLink2URL: https://jlcpcb.com/partdetail/C5142552; ComponentLink3Description: LCSC Part URL; ComponentLink3URL: https://lcsc.com/product-detail/Multilayer-Ceramic-Capacitors-MLCC---SMD-SMT_CCTC-CCTC-TCC0201COG100J500ZT_C5142552.html
footprint CAP-0201 (0201 (0603M) Capacitor)
pins: 1, 2

## TCC0201COG150J500ZT
designator C?  Capacitance: 15pF  (hidden comment: *)
Capacitor, Ceramic (MLCC), 15pF, ±5%, 50V, C0G, ±5%, SMD 0201; Manufacturer: CCTC; Manufacturer Part Number: TCC0201COG150J500ZT; Package Size: 0201; JLCPCB Basic Part: No; JLCPCB Part Number: C5142550; Supplier 1: LCSC; Category: Capacitors - MLCC; Supplier Part Number 1: C5142550; Tolerance: ±5%; Voltage Rating: 50V; Temperature Coefficient: C0G; RoHS: Yes; ComponentLink1Description: Datasheet; ComponentLink1URL: https://wmsc.lcsc.com/wmsc/upload/file/pdf/v2/lcsc/2209011730_CCTC-TCC0201COG150J500ZT_C5142550.pdf; ComponentLink2Description: JLCPCB Part URL; ComponentLink2URL: https://jlcpcb.com/partdetail/C5142550; ComponentLink3Description: LCSC Part URL; ComponentLink3URL: https://lcsc.com/product-detail/Multilayer-Ceramic-Capacitors-MLCC---SMD-SMT_CCTC-CCTC-TCC0201COG150J500ZT_C5142550.html
footprint CAP-0201 (0201 (0603M) Capacitor)
pins: 1, 2

## TCC0201COG220J500ZT
designator C?  Capacitance: 22pF  (hidden comment: *)
Capacitor, Ceramic (MLCC), 22pF, ±5%, 50V, C0G, ±5%, SMD 0201; Manufacturer: CCTC; Manufacturer Part Number: TCC0201COG220J500ZT; Package Size: 0201; JLCPCB Basic Part: No; JLCPCB Part Number: C5142546; Supplier 1: LCSC; Category: Capacitors - MLCC; Supplier Part Number 1: C5142546; Tolerance: ±5%; Voltage Rating: 50V; Temperature Coefficient: C0G; RoHS: Yes; ComponentLink1Description: Datasheet; ComponentLink1URL: https://wmsc.lcsc.com/wmsc/upload/file/pdf/v2/lcsc/2209011730_CCTC-TCC0201COG220J500ZT_C5142546.pdf; ComponentLink2Description: JLCPCB Part URL; ComponentLink2URL: https://jlcpcb.com/partdetail/C5142546; ComponentLink3Description: LCSC Part URL; ComponentLink3URL: https://lcsc.com/product-detail/Multilayer-Ceramic-Capacitors-MLCC---SMD-SMT_CCTC-CCTC-TCC0201COG220J500ZT_C5142546.html
footprint CAP-0201 (0201 (0603M) Capacitor)
pins: 1, 2

## TCC0201COG270J500ZT
designator C?  Capacitance: 27pF  (hidden comment: *)
Capacitor, Ceramic (MLCC), 27pF, ±5%, 50V, C0G, ±5%, SMD 0201; Manufacturer: CCTC; Manufacturer Part Number: TCC0201COG270J500ZT; Package Size: 0201; JLCPCB Basic Part: No; JLCPCB Part Number: C5142547; Supplier 1: LCSC; Category: Capacitors - MLCC; Supplier Part Number 1: C5142547; Tolerance: ±5%; Voltage Rating: 50V; Temperature Coefficient: C0G; RoHS: Yes; ComponentLink1Description: Datasheet; ComponentLink1URL: https://wmsc.lcsc.com/wmsc/upload/file/pdf/v2/lcsc/2209011730_CCTC-TCC0201COG270J500ZT_C5142547.pdf; ComponentLink2Description: JLCPCB Part URL; ComponentLink2URL: https://jlcpcb.com/partdetail/C5142547; ComponentLink3Description: LCSC Part URL; ComponentLink3URL: https://lcsc.com/product-detail/Multilayer-Ceramic-Capacitors-MLCC---SMD-SMT_CCTC-CCTC-TCC0201COG270J500ZT_C5142547.html
footprint CAP-0201 (0201 (0603M) Capacitor)
pins: 1, 2

## TCC0201COG300J500ZT
designator C?  Capacitance: 30pF  (hidden comment: *)
Capacitor, Ceramic (MLCC), 30pF, ±5%, 50V, C0G, ±5%, SMD 0201; Manufacturer: CCTC; Manufacturer Part Number: TCC0201COG300J500ZT; Package Size: 0201; JLCPCB Basic Part: No; JLCPCB Part Number: C5142545; Supplier 1: LCSC; Category: Capacitors - MLCC; Supplier Part Number 1: C5142545; Tolerance: ±5%; Voltage Rating: 50V; Temperature Coefficient: C0G; RoHS: Yes; ComponentLink1Description: Datasheet; ComponentLink1URL: https://wmsc.lcsc.com/wmsc/upload/file/pdf/v2/lcsc/2209011730_CCTC-TCC0201COG300J500ZT_C5142545.pdf; ComponentLink2Description: JLCPCB Part URL; ComponentLink2URL: https://jlcpcb.com/partdetail/C5142545; ComponentLink3Description: LCSC Part URL; ComponentLink3URL: https://lcsc.com/product-detail/Multilayer-Ceramic-Capacitors-MLCC---SMD-SMT_CCTC-CCTC-TCC0201COG300J500ZT_C5142545.html
footprint CAP-0201 (0201 (0603M) Capacitor)
pins: 1, 2